# Altium footprint library Lapwing.PcbLib: 81 footprints (part 1 of 6)
Each footprint in its own frame and in the unit in brackets; x right, y up, seen from the top. Pads: shape width x height; smd on the part's side, far side on the other; paste and mask are expansions set on the pad; w line width, h text height; cw(c..) or ccw(c..) is an arc to the next point about the centre after c.
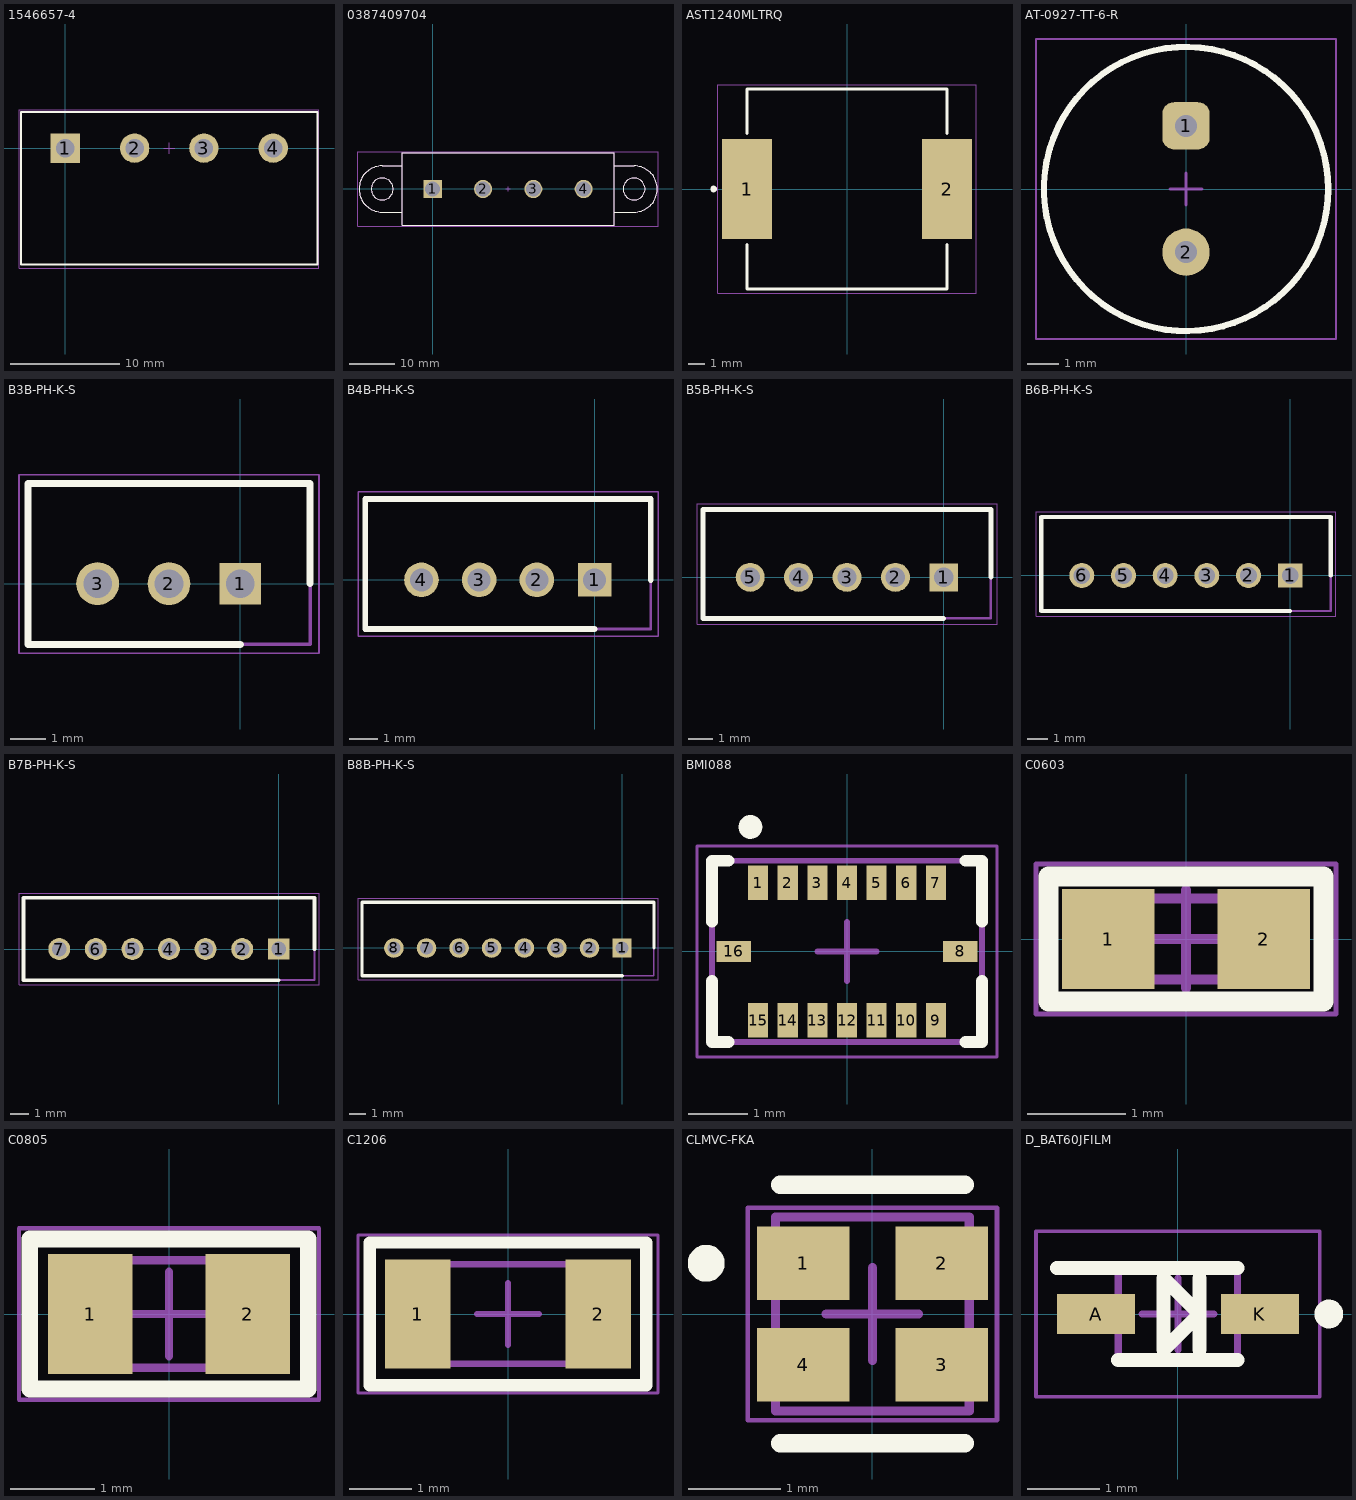
[diagram p0: the footprints below, top view; thin cyan lines are the x and y axes]

## 1546657-4 [mm] "BARRIER STRIP 4WAY 0.25\""
pads (4):
  rect 2.7x2.7 hole 1.702: 1(0,0)
  round 2.7 hole 1.702: 2(6.35,0) 3(12.7,0) 4(19.05,0)
Top Overlay:
  lines w0.2: -4.064,-10.668 23.114,-10.668 23.114,3.302 -4.064,3.302 -4.064,-10.668
Mechanical 13:
  lines w0.1: -4.064,-10.668 -4.064,3.302 23.114,3.302 23.114,-10.668 -4.064,-10.668
Mechanical 15:
  lines w0.05: -4.25,-11 23.25,-11 23.25,3.5 -4.25,3.5 -4.25,-11
  lines w0.1: 9.025,0 10.025,0 ; 9.525,-0.5 9.525,0.5
3D body "c-1546657-4-c-3d.stp": height 15, standoff -4.3, extent -3.625,-10.698 22.675,3.302

## 0387409704 [mm] "BARRIER STRIP 4WAY 0.438\""
pads (4):
  rect 4x4 hole 3.3: 1(0,0)
  round 4 hole 3.3: 2(11.11,0) 3(22.22,0) 4(33.33,0)
Top Overlay:
  circle w0.2: c44.48,0 r2.415
  circle w0.2: c-11.15,0 r2.415
  lines w0.2: -6.735,-5.1 -11.15,-5.1 cw(c-11.15,0) -11.15,5.1 -6.735,5.1 ; 40.065,-5.1 44.48,-5.1 ccw(c44.48,0) 44.48,5.1 40.065,5.1 ; -6.735,-8 40.065,-8 40.065,8 -6.735,8 -6.735,-8
Mechanical 13:
  circle w0.1: c-11.15,0 r2.415
  circle w0.1: c44.48,0 r2.415
  lines w0.1: -6.735,-5.1 -11.15,-5.1 cw(c-11.15,0) -11.15,5.1 -6.735,5.1 ; 40.065,-5.1 44.48,-5.1 ccw(c44.48,0) 44.48,5.1 40.065,5.1 ; -6.735,-8 -6.735,8 40.065,8 40.065,-8 -6.735,-8
Mechanical 15:
  lines w0.05: -16.5,-8.25 -16.5,8.25 49.75,8.25 49.75,-8.25 -16.5,-8.25
  lines w0.1: 16.165,0 17.165,0 ; 16.665,-0.5 16.665,0.5

## AST1240MLTRQ [mm]
pads (2):
  rect 3x6 smd: 1(-6,0) 2(6,0)
Top Overlay:
  circle w0.2: c-8,0 r0.1
  lines w0.2: -6,-3.35 -6,-6 6,-6 6,-3.35 ; -6,3.35 -6,6 6,6 6,3.35
Mechanical 15:
  lines w0.05: -7.75,-6.25 7.75,-6.25 7.75,6.25 -7.75,6.25 -7.75,-6.25
3D body "AST1240MLTRQ_MAL.step": height 3.3, standoff 0, extent -6.248,-6.248 6.248,6.248

## AT-0927-TT-6-R [mm] "BUZZER TH"
pads (2):
  rrect50% 1.5x1.5 hole 0.7: 1(0,2)
  round 1.5 hole 0.7: 2(0,-2)
Top Overlay:
  circle w0.2: c0,0 r4.5
Mechanical 13:
  circle w0.1: c0,0 r4.5
Mechanical 15:
  lines w0.05: -4.75,-4.75 4.75,-4.75 4.75,4.75 -4.75,4.75 -4.75,-4.75
  lines w0.1: -0.5,0 0.5,0 ; 0,-0.5 0,0.5
3D body "AT-0927-TT-6-R.stp": height 4.9, standoff -5, extent -4.5,-4.5 4.5,4.5

## B3B-PH-K-S [mm]
pads (3):
  rect 1.162x1.162 hole 0.8: 1(0,0)
  round 1.2 hole 0.8: 2(-2,0) 3(-4,0)
Top Overlay:
  lines w0.2: 0,-1.7 -5.95,-1.7 -5.95,2.8 1.95,2.8 1.95,0
Mechanical 13:
  lines w0.1: -5.95,-1.7 -5.95,2.8 1.95,2.8 1.95,-1.7 -5.95,-1.7
Mechanical 15:
  lines w0.05: -6.2,-1.95 2.2,-1.95 2.2,3.05 -6.2,3.05 -6.2,-1.95
3D body "B3B-PH-K-S.STEP": height 6, standoff -3.4, extent -5.95,-1.725 1.95,2.775

## B4B-PH-K-S [mil]
pads (4):
  rect 45.74x45.74 hole 31.5: 1(0,0)
  round 47.24 hole 31.5: 2(-78.74,0) 3(-157.48,0) 4(-236.22,0)
Top Overlay:
  lines w7.87: 0,-66.93 -312.99,-66.93 -312.99,110.24 76.77,110.24 76.77,0
Mechanical 13:
  lines w3.94: -312.99,-66.93 -312.99,110.24 76.77,110.24 76.77,-66.93 -312.99,-66.93
Mechanical 15:
  lines w1.97: -322.83,-76.77 -322.83,120.08 86.61,120.08 86.61,-76.77 -322.83,-76.77
3D body "B4B-PH-K-S.STEP": height 236.22, standoff -133.86, extent -312.99,-66.93 76.77,110.24

## B5B-PH-K-S [mil]
pads (5):
  rect 45.75x45.74 hole 31.5: 1(0,0)
  round 47.24 hole 31.5: 2(-78.74,0) 3(-157.48,0) 4(-236.22,0) 5(-314.96,0)
Top Overlay:
  lines w7.87: 0,-66.93 -391.73,-66.93 -391.73,110.24 76.77,110.24 76.77,0
Mechanical 13:
  lines w3.94: -391.73,-66.93 -391.73,110.24 76.77,110.24 76.77,-66.93 -391.73,-66.93
Mechanical 15:
  lines w1.97: -401.57,-76.77 -401.57,120.08 86.61,120.08 86.61,-76.77 -401.57,-76.77
3D body "B5B-PH-K-S.STEP": height 236.22, standoff -133.86, extent -392.72,-67.91 75.79,109.25

## B6B-PH-K-S [mm]
pads (6):
  rect 1.162x1.162 hole 0.8: 1(0,0)
  round 1.2 hole 0.8: 2(-2,0) 3(-4,0) 4(-6,0) 5(-8,0) 6(-10,0)
Top Overlay:
  lines w0.2: 0,-1.7 -11.95,-1.7 -11.95,2.8 1.95,2.8 1.95,0
Mechanical 13:
  lines w0.1: -11.95,-1.7 1.95,-1.7 1.95,2.8 -11.95,2.8 -11.95,-1.7
Mechanical 15:
  lines w0.05: -12.2,-1.95 -12.2,3.05 2.2,3.05 2.2,-1.95 -12.2,-1.95
3D body "B6B-PH-K-S.STEP": height 6, standoff -3.4, extent -11.95,-1.7 1.95,2.8

## B7B-PH-K-S [mm]
pads (7):
  rect 1.162x1.162 hole 0.8: 1(0,0)
  round 1.2 hole 0.8: 2(-2,0) 3(-4,0) 4(-6,0) 5(-8,0) 6(-10,0) 7(-12,0)
Top Overlay:
  lines w0.2: 0,-1.7 -13.95,-1.7 -13.95,2.8 1.95,2.8 1.95,0
Mechanical 13:
  lines w0.1: -13.95,-1.7 1.95,-1.7 1.95,2.8 -13.95,2.8 -13.95,-1.7
Mechanical 15:
  lines w0.05: -14.2,-1.95 -14.2,3.05 2.2,3.05 2.2,-1.95 -14.2,-1.95
3D body "B7B-PH-K-S.STEP": height 6, standoff -3.4, extent -13.95,-1.7 1.95,2.8

## B8B-PH-K-S [mm]
pads (8):
  rect 1.162x1.162 hole 0.8: 1(0,0)
  round 1.2 hole 0.8: 2(-2,0) 3(-4,0) 4(-6,0) 5(-8,0) 6(-10,0) 7(-12,0) 8(-14,0)
Top Overlay:
  lines w0.2: 0,-1.7 -15.95,-1.7 -15.95,2.8 1.95,2.8 1.95,0
Mechanical 13:
  lines w0.1: -15.95,-1.7 1.95,-1.7 1.95,2.8 -15.95,2.8 -15.95,-1.7
Mechanical 15:
  lines w0.05: -16.2,-1.95 2.2,-1.95 2.2,3.05 -16.2,3.05 -16.2,-1.95
3D body "B8B-PH-K-S.STEP": height 6, standoff -3.4, extent -15.975,-1.7 1.925,2.8

## BMI088 [mm]
pads (16):
  rect 0.34x0.58 smd: 1(-1.5,1.16) 2(-1,1.16) 3(-0.5,1.16) 4(0,1.16) 5(0.5,1.16) 6(1,1.16) 7(1.5,1.16) 9(1.5,-1.16) 10(1,-1.16) 11(0.5,-1.16) 12(0,-1.16) 13(-0.5,-1.16) 14(-1,-1.16) 15(-1.5,-1.16)
  rect 0.58x0.35 smd: 8(1.91,0) 16(-1.91,0)
Top Overlay:
  circle w0.2: c-1.629,2.1 r0.1
  lines w0.2: -2.28,-0.5 -2.28,-1.53 -2,-1.53 ; -2.28,0.5 -2.28,1.53 -2,1.53 ; 2,-1.53 2.28,-1.53 2.28,-0.5 ; 2,1.53 2.28,1.53 2.28,0.5
Mechanical 13:
  lines w0.1: -2.28,-1.53 -2.28,1.53 2.28,1.53 2.28,-1.53 -2.28,-1.53
Mechanical 15:
  lines w0.05: -2.53,-1.78 -2.53,1.78 2.53,1.78 2.53,-1.78 -2.53,-1.78
  lines w0.1: -0.5,0 0.5,0 ; 0,-0.5 0,0.5
3D body "BMI088--3DModel-STEP-56544.STEP": height 1, standoff 0, extent -2.25,-1.5 2.25,1.5

## C0603 [mm] "CAP 0603"
pads (2):
  rect 0.94x1.02 smd: 1(-0.79,0) 2(0.79,0)
Top Overlay:
  lines w0.2: -1.397,-0.635 -1.397,0.635 1.397,0.635 1.397,-0.635 -1.397,-0.635
Mechanical 13:
  lines w0.1: -0.813,-0.412 -0.813,0.412 0.813,0.412 0.813,-0.412 -0.813,-0.412
Mechanical 15:
  lines w0.05: -1.524,-0.762 1.524,-0.762 1.524,0.762 -1.524,0.762 -1.524,-0.762
  lines w0.1: -0.5,0 0.5,0 ; 0,-0.5 0,0.5
3D body "CAP0603.STEP": height 0.82, standoff 0, extent -0.8,-0.412 0.8,0.412

## C0805 [mm] "CAP 0805"
pads (2):
  rect 1x1.42 smd: 1(-0.935,0) 2(0.935,0)
Top Overlay:
  lines w0.127: -1.651,-0.89 -1.651,-0.889
  lines w0.2: -1.651,-0.89 1.651,-0.89 1.651,0.889 ; -1.651,-0.889 -1.651,0.889 1.651,0.89
Mechanical 13:
  lines w0.1: -1.016,-0.637 -1.016,0.637 1.016,0.637 1.016,-0.637 -1.016,-0.637
Mechanical 15:
  lines w0.05: -1.778,-1.016 -1.778,1.016 1.778,1.016 1.778,-1.016 -1.778,-1.016
  lines w0.1: -0.5,0 0.5,0 ; 0,-0.5 0,0.5
3D body "CAP0805.STEP": height 1.27, standoff 0, extent -1,-0.637 1,0.637

## C1206 [mm] "CAP 1206"
pads (2):
  rect 1.05x1.75 smd: 1(-1.45,0) 2(1.45,0)
Top Overlay:
  lines w0.2: -2.225,-1.143 -2.225,1.15 2.225,1.15 2.225,-1.143 -2.225,-1.143
Mechanical 13:
  lines w0.1: -1.6,-0.8 -1.6,0.8 1.6,0.8 1.6,-0.8 -1.6,-0.8
Mechanical 15:
  lines w0.05: -2.413,-1.27 -2.413,1.27 2.413,1.27 2.413,-1.27 -2.413,-1.27
  lines w0.1: -0.5,0 0.5,0 ; 0,-0.5 0,0.5
3D body "CAP1206-1.2mm.STEP": height 1.2, standoff 0, extent -1.6,-0.8 1.6,0.8

## CLMVC-FKA [mm] "LED RGB"
pads (4):
  rect 1x0.8 smd paste+0 mask+0: 1(-0.75,0.55) 2(0.75,0.55) 3(0.75,-0.55) 4(-0.75,-0.55)
Top Overlay:
  circle w0.2: c-1.8,0.55 r0.1
  lines w0.2: -1,-1.4 1,-1.4 ; -1,1.4 1,1.4
Mechanical 13:
  lines w0.1: -1.05,-1.05 -1.05,1.05 1.05,1.05 1.05,-1.05 -1.05,-1.05
Mechanical 15:
  lines w0.05: -1.35,-1.15 1.35,-1.15 1.35,1.15 -1.35,1.15 -1.35,-1.15
  lines w0.1: -0.5,0 0.5,0 ; 0,-0.5 0,0.5
3D body "Diode_Cree_CLMVB-FKA-CFHEHLCBB7A363_eec.STEP": height 0.91, standoff 0.03, extent -1,-1 1,1

## D_BAT60JFILM [mm] "DIODE SOD323"
pads (2):
  rect 1.085x0.55 smd: A(-1.14,0) K(1.14,0)
Top Overlay:
  circle w0.2: c2.1,0 r0.1
  lines w0.2: -1.682,0.64 0.83,0.64 ; -0.83,-0.64 0.83,-0.64 ; 0.3,-0.5 0.3,0.5 ; -0.2,-0.5 -0.2,0.5 0.3,0 -0.2,-0.5
Mechanical 13:
  lines w0.1: -0.83,-0.64 0.83,-0.64 0.83,0.64 -0.83,0.64 -0.83,-0.64
Mechanical 15:
  lines w0.05: -1.975,-1.15 1.975,-1.15 1.975,1.15 -1.975,1.15 -1.975,-1.15
  lines w0.1: -0.5,0 0.5,0 ; 0,-0.5 0,0.5
3D body "BAT60JFILM.stp": height 1.17, standoff 0, extent -1.25,-0.64 1.25,0.64